# Altium schematic symbol library microbuilder.SCHLIB: 530 symbols (part 5 of 7)
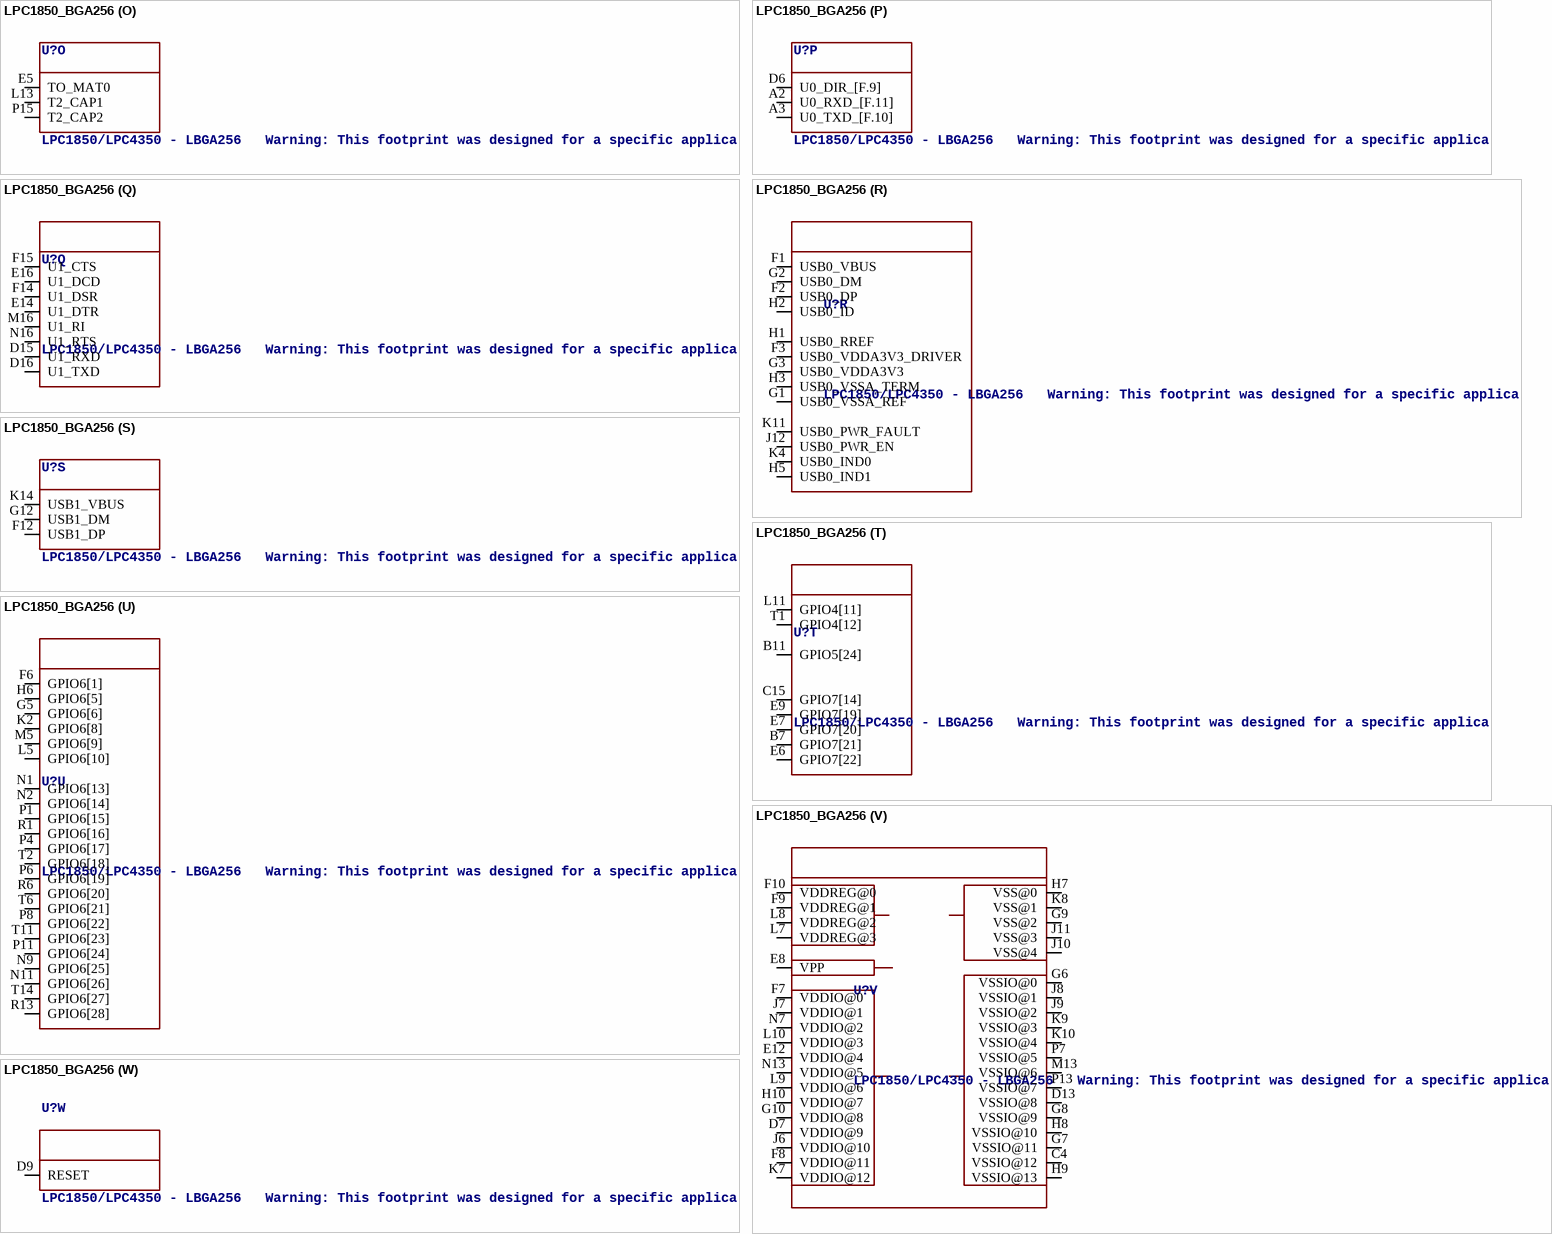
[diagram p56: symbol LPC1850_BGA256]

## LPC1850_BGA256
designator U?, comment LPC1850/LPC4350 - LBGA256   Warning: This footprint was designed for a specific application, and numerous choices have been made concering the PINMUX to make certain peripherals available at the expense of others.  These pin choices may not be appropriate in your own situation (for example, only one set of selection pins is broken out for the EMC rather than all four, although some pins on GPIO6 can be sacrificed to enable another memory device on the EMC using CS2).
footprint LBGA256_1.0MM
part A pins: A4 ADC1_2, A5 ADC1_6, B2 VSSA, B3 ADC1_5, B4 VDDA, B5 ADC1_3, C3 ADC1_1, C5 ADC1_7, C6 ADC1_4, E3 DAC, F5 ADC1_0
part B pins: C16 EMC_A4, D14 EMC_CLK23, E15 EMC_A3, F16 EMC_A2, G13 EMC_A23, G15 EMC_DQMOUT0, G16 EMC_A1, H12 EMC_CKEOUT0, H13 EMC_A14, H14 EMC_A9, H15 EMC_DQMOUT1, H16 EMC_A0, J13 EMC_A15, J15 EMC_DYCS0, J16 EMC_A8, K12 EMC_A21, K13 EMC_A22, K16 EMC_A10, L14 EMC_BLS1, M14 EMC_A20, M15 EMC_A11, N3 EMC_D12, N5 EMC_CLK01, N14 EMC_A19, N15 EMC_A12, P2 EMC_A5, P3 EMC_D13, P5 EMC_OE, P9 EMC_D8, P10 EMC_D9, P14 EMC_A18, P16 EMC_RAS, R2 EMC_A6, R3 EMC_A7, R4 EMC_D14, R5 EMC_CS0, R7 EMC_D1, R8 EMC_D3, R9 EMC_D5, R10 EMC_D6, R11 EMC_D7, R12 EMC_D11, R14 EMC_A16, R16 EMC_CAS, T3 EMC_BLS0, T4 EMC_WE, T5 EMC_D0, T7 EMC_D2, T8 EMC_D15, T9 EMC_D4, T13 EMC_D10, T15 EMC_A17, T16 EMC_A13
part C pins: A1 LCD_VD0_[4.1], A6 LCD_VD13_[B.6], A7 LCD_VD8_[7.5], A12 LCD_VD14_[B.5], A13 LCD_VD20_[B.3], A14 LCD_VD22_[B.1], A16 LCD_VD18_[7.2], B1 LCD_VD1_[4.4], B6 LCD_PWR_[7.7], B12 LCD_VD21_[B.2], B15 LCD_VD23_[B.0], B16 LCD_LE_[7.0], C1 LCD_ENBL_[4.6], C2 LCD_VD2_[4.3], C7 LCD_LP_[7.6], C8 LCD_VD16_[7.4], C13 LCD_VD17_[7.3], C14 LCD_VD19_[7.1], D2 LCD_FP_[4.5], D3 LCD_VD3_[4.2], E2 LCD_VD9_[4.8], G11 LCD_VD15_[B.4], H4 LCD_DCLK_[4.7], J1 LCD_VD6_[8.5], J2 LCD_VD7_[8.4], J3 LCD_VD12_[8.3], K1 LCD_VD4_[8.7], K3 LCD_VD5_[8.6], L2 LCD_VD11_[4.9], M3 LCD_VD10_[4.10]
part D pins: A8 RTCX1, A11 RTC_ALARM, B8 RTCX2, B10 VBAT
part E pins: L1 CGU_OUT0, L12 CGU_OUT1
part F pins: D4 ENET_RX_CLK, E4 ENET_MDC, F4 ENET_TX_EN, G4 ENET_TX_ER, L3 ENET_RXD1, M2 ENET_COL, M6 ENET_RXD2, M7 ENET_CRS, M8 ENET_MDIO, M9 ENET_TXD3, M10 ENET_TXD1, M11 ENET_TX_CLK, N4 ENET_RX_DV, N6 ENET_RX_ER, N8 ENET_RXD3, N10 ENET_TXD2, N12 ENET_TXD0, T12 ENET_RXD0
part G pins: D1 XTAL1, E1 XTAL2, T10 CLKOUT
part H pins: E13 I2C1_SCL, G14 I2C1_SDA, L15 I2C0_SCL, L16 I2C0_SDA
part I pins: D10 I2S0_RX_SCK, F11 I2S0_RX_SDA, F13 I2S0_TX_SCK, L6 I2S0_TX_SDA, M1 I2S0_TX_WS, R15 I2S0_RX_WS
part J pins: J4 TDI, J5 TCK/SWDCLK, K5 TDO/SWO, K6 TMS/SWDIO, L4 DBGEN, M4 TRST
part K pins: A9 WAKEUP0, A10 WAKEUP1, C9 WAKEUP2, D5 NMI_EXT, D8 WAKEUP3
part L pins: H11 QEI_PHA, J14 QEI_IDX, K15 QEI_PHB
part M pins: A15 SPIFI_SIO3, B13 SPIFI_MISO, B14 SPIFI_SCK, C10 SPIFI_CS, C11 SPIFI_MOSI, C12 SPIFI_SIO2
part N pins: D11 SSP0_MISO, D12 SSP0_SCK, E10 SSP0_MOSI, E11 SSP0_SSEL
part O pins: E5 TO_MAT0, L13 T2_CAP1, P15 T2_CAP2
part P pins: A2 U0_RXD_[F.11], A3 U0_TXD_[F.10], D6 U0_DIR_[F.9]
part Q pins: D15 U1_RXD, D16 U1_TXD, E14 U1_DTR, E16 U1_DCD, F14 U1_DSR, F15 U1_CTS, M16 U1_RI, N16 U1_RTS
part R pins: F1 USB0_VBUS, F2 USB0_DP, F3 USB0_VDDA3V3_DRIVER, G1 USB0_VSSA_REF, G2 USB0_DM, G3 USB0_VDDA3V3, H1 USB0_RREF, H2 USB0_ID, H3 USB0_VSSA_TERM, H5 USB0_IND1, J12 USB0_PWR_EN, K4 USB0_IND0, K11 USB0_PWR_FAULT
part S pins: F12 USB1_DP, G12 USB1_DM, K14 USB1_VBUS
part T pins: B7 GPIO7[21], B11 GPIO5[24], C15 GPIO7[14], E6 GPIO7[22], E7 GPIO7[20], E9 GPIO7[19], L11 GPIO4[11], T1 GPIO4[12]
part U pins: F6 GPIO6[1], G5 GPIO6[6], H6 GPIO6[5], K2 GPIO6[8], L5 GPIO6[10], M5 GPIO6[9], N1 GPIO6[13], N2 GPIO6[14], N9 GPIO6[25], N11 GPIO6[26], P1 GPIO6[15], P4 GPIO6[17], P6 GPIO6[19], P8 GPIO6[22], P11 GPIO6[24], R1 GPIO6[16], R6 GPIO6[20], R13 GPIO6[28], T2 GPIO6[18], T6 GPIO6[21], T11 GPIO6[23], T14 GPIO6[27]
part V pins: C4 VSSIO@12 (power), D7 VDDIO@9 (power), D13 VSSIO@8 (power), E8 VPP (power), E12 VDDIO@4 (power), F7 VDDIO@0 (power), F8 VDDIO@11 (power), F9 VDDREG@1 (power), F10 VDDREG@0 (power), G6 VSSIO@0 (power), G7 VSSIO@11 (power), G8 VSSIO@9 (power), G9 VSS@2 (power), G10 VDDIO@8 (power), H7 VSS@0 (power), H8 VSSIO@10 (power), H9 VSSIO@13 (power), H10 VDDIO@7 (power), J6 VDDIO@10 (power), J7 VDDIO@1 (power), J8 VSSIO@1 (power), J9 VSSIO@2 (power), J10 VSS@4 (power), J11 VSS@3 (power), K7 VDDIO@12 (power), K8 VSS@1 (power), K9 VSSIO@3 (power), K10 VSSIO@4 (power), L7 VDDREG@3 (power), L8 VDDREG@2 (power), L9 VDDIO@6 (power), L10 VDDIO@3 (power), M13 VSSIO@6 (power), N7 VDDIO@2 (power), N13 VDDIO@5 (power), P7 VSSIO@5 (power), P13 VSSIO@7 (power)
part W pins: D9 RESET

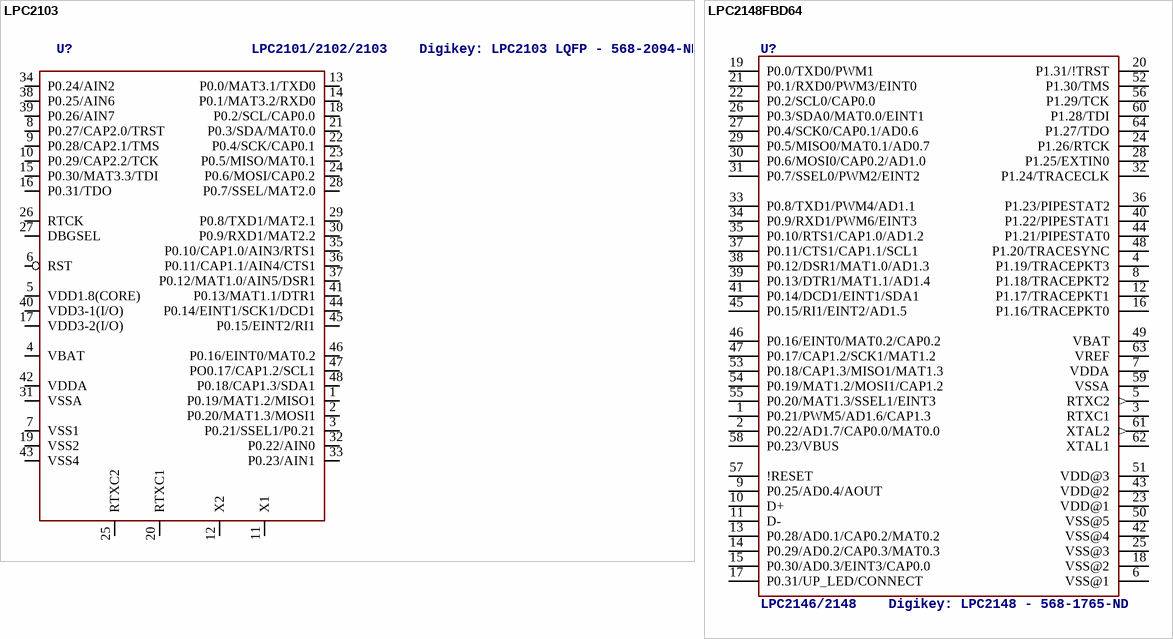
[diagram p39: symbols LPC2103 to LPC2148FBD64]

## LPC2103
designator U?, comment LPC2101/2102/2103    Digikey: LPC2103 LQFP - 568-2094-ND
footprint LQFP48
pins: 1 P0.19/MAT1.2/MISO1, 2 P0.20/MAT1.3/MOSI1, 3 P0.21/SSEL1/P0.21, 4 VBAT, 5 VDD1.8(CORE), 6 RST, 7 VSS1, 8 P0.27/CAP2.0/TRST, 9 P0.28/CAP2.1/TMS, 10 P0.29/CAP2.2/TCK, 11 X1, 12 X2, 13 P0.0/MAT3.1/TXD0, 14 P0.1/MAT3.2/RXD0, 15 P0.30/MAT3.3/TDI, 16 P0.31/TDO, 17 VDD3-2(I/O), 18 P0.2/SCL/CAP0.0, 19 VSS2, 20 RTXC1, 21 P0.3/SDA/MAT0.0, 22 P0.4/SCK/CAP0.1, 23 P0.5/MISO/MAT0.1, 24 P0.6/MOSI/CAP0.2, 25 RTXC2, 26 RTCK, 27 DBGSEL, 28 P0.7/SSEL/MAT2.0, 29 P0.8/TXD1/MAT2.1, 30 P0.9/RXD1/MAT2.2, 31 VSSA, 32 P0.22/AIN0, 33 P0.23/AIN1, 34 P0.24/AIN2, 35 P0.10/CAP1.0/AIN3/RTS1, 36 P0.11/CAP1.1/AIN4/CTS1, 37 P0.12/MAT1.0/AIN5/DSR1, 38 P0.25/AIN6, 39 P0.26/AIN7, 40 VDD3-1(I/O), 41 P0.13/MAT1.1/DTR1, 42 VDDA, 43 VSS4, 44 P0.14/EINT1/SCK1/DCD1, 45 P0.15/EINT2/RI1, 46 P0.16/EINT0/MAT0.2, 47 PO0.17/CAP1.2/SCL1, 48 P0.18/CAP1.3/SDA1

## LPC2148FBD64
designator U?, comment LPC2146/2148    Digikey: LPC2148 - 568-1765-ND
footprint LQFP64
pins: 1 P0.21/PWM5/AD1.6/CAP1.3, 2 P0.22/AD1.7/CAP0.0/MAT0.0, 3 RTXC1, 4 P1.19/TRACEPKT3, 5 RTXC2 (out), 6 VSS@1 (power), 7 VDDA (power), 8 P1.18/TRACEPKT2, 9 P0.25/AD0.4/AOUT, 10 D+, 11 D-, 12 P1.17/TRACEPKT1, 13 P0.28/AD0.1/CAP0.2/MAT0.2, 14 P0.29/AD0.2/CAP0.3/MAT0.3, 15 P0.30/AD0.3/EINT3/CAP0.0, 16 P1.16/TRACEPKT0, 17 P0.31/UP_LED/CONNECT, 18 VSS@2 (power), 19 P0.0/TXD0/PWM1, 20 P1.31/!TRST, 21 P0.1/RXD0/PWM3/EINT0, 22 P0.2/SCL0/CAP0.0, 23 VDD@1 (power), 24 P1.26/RTCK, 25 VSS@3 (power), 26 P0.3/SDA0/MAT0.0/EINT1, 27 P0.4/SCK0/CAP0.1/AD0.6, 28 P1.25/EXTIN0, 29 P0.5/MISO0/MAT0.1/AD0.7, 30 P0.6/MOSI0/CAP0.2/AD1.0, 31 P0.7/SSEL0/PWM2/EINT2, 32 P1.24/TRACECLK, 33 P0.8/TXD1/PWM4/AD1.1, 34 P0.9/RXD1/PWM6/EINT3, 35 P0.10/RTS1/CAP1.0/AD1.2, 36 P1.23/PIPESTAT2, 37 P0.11/CTS1/CAP1.1/SCL1, 38 P0.12/DSR1/MAT1.0/AD1.3, 39 P0.13/DTR1/MAT1.1/AD1.4, 40 P1.22/PIPESTAT1, 41 P0.14/DCD1/EINT1/SDA1, 42 VSS@4 (power), 43 VDD@2 (power), 44 P1.21/PIPESTAT0, 45 P0.15/RI1/EINT2/AD1.5, 46 P0.16/EINT0/MAT0.2/CAP0.2, 47 P0.17/CAP1.2/SCK1/MAT1.2, 48 P1.20/TRACESYNC, 49 VBAT (power), 50 VSS@5 (power), 51 VDD@3 (power), 52 P1.30/TMS, 53 P0.18/CAP1.3/MISO1/MAT1.3, 54 P0.19/MAT1.2/MOSI1/CAP1.2, 55 P0.20/MAT1.3/SSEL1/EINT3, 56 P1.29/TCK, 57 !RESET, 58 P0.23/VBUS, 59 VSSA (power), 60 P1.28/TDI, 61 XTAL2 (out), 62 XTAL1, 63 VREF, 64 P1.27/TDO

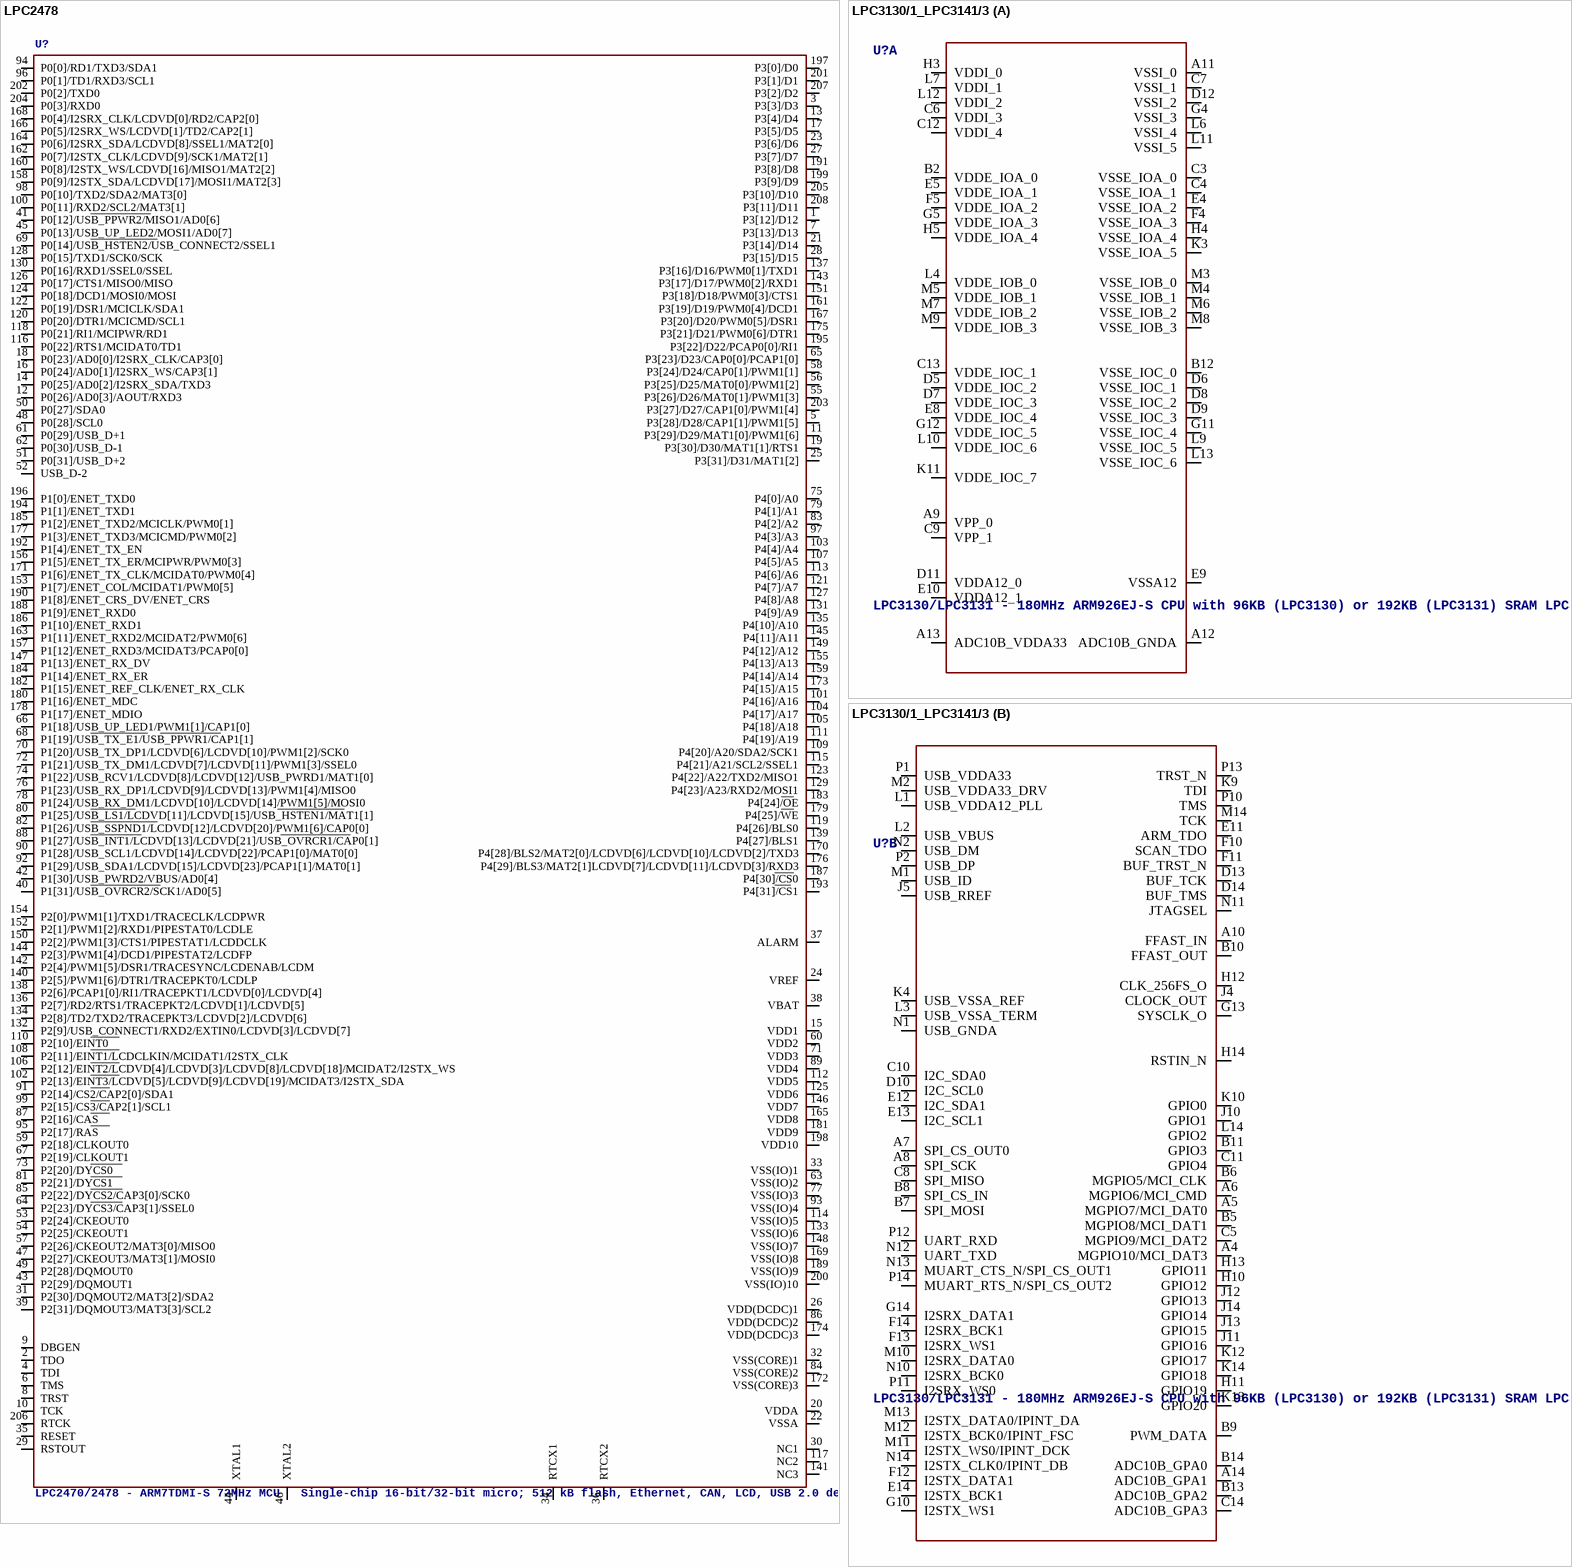
[diagram p40: symbols LPC2478 to LPC3130/1_LPC3141/3]

## LPC2478
designator U?, comment LPC2470/2478 - ARM7TDMI-S 72MHz MCU   Single-chip 16-bit/32-bit micro; 512 kB flash, Ethernet, CAN, LCD, USB 2.0 device/host/OTG, external memory interface   Digikey: 568-4363-ND
footprint LQFP208
pins: 1 P3[12]/D12, 2 TDO, 3 P3[3]/D3, 4 TDI, 5 P3[28]/D28/CAP1[1]/PWM1[5], 6 TMS, 7 P3[13]/D13, 8 TRST, 9 DBGEN, 10 TCK, 11 P3[29]/D29/MAT1[0]/PWM1[6], 12 P0[26]/AD0[3]/AOUT/RXD3, 13 P3[4]/D4, 14 P0[25]/AD0[2]/I2SRX_SDA/TXD3, 15 VDD1, 16 P0[24]/AD0[1]/I2SRX_WS/CAP3[1], 17 P3[5]/D5, 18 P0[23]/AD0[0]/I2SRX_CLK/CAP3[0], 19 P3[30]/D30/MAT1[1]/RTS1, 20 VDDA, 21 P3[14]/D14, 22 VSSA, 23 P3[6]/D6, 24 VREF, 25 P3[31]/D31/MAT1[2], 26 VDD(DCDC)1, 27 P3[7]/D7, 28 P3[15]/D15, 29 RSTOUT, 30 NC1, 31 P2[30]/DQMOUT2/MAT3[2]/SDA2, 32 VSS(CORE)1, 33 VSS(IO)1, 34 RTCX1, 35 RESET, 36 RTCX2, 37 ALARM, 38 VBAT, 39 P2[31]/DQMOUT3/MAT3[3]/SCL2, 40 P1[31]/USB_OVRCR2/SCK1/AD0[5], 41 P0[12]/USB_PPWR2/MISO1/AD0[6], 42 P1[30]/USB_PWRD2/VBUS/AD0[4], 43 P2[29]/DQMOUT1, 44 XTAL1, 45 P0[13]/USB_UP_LED2/MOSI1/AD0[7], 46 XTAL2, 47 P2[27]/CKEOUT3/MAT3[1]/MOSI0, 48 P0[28]/SCL0, 49 P2[28]/DQMOUT0, 50 P0[27]/SDA0, 51 P0[31]/USB_D+2, 52 USB_D-2, 53 P2[24]/CKEOUT0, 54 P2[25]/CKEOUT1, 55 P3[26]/D26/MAT0[1]/PWM1[3], 56 P3[25]/D25/MAT0[0]/PWM1[2], 57 P2[26]/CKEOUT2/MAT3[0]/MISO0, 58 P3[24]/D24/CAP0[1]/PWM1[1], 59 P2[18]/CLKOUT0, 60 VDD2, 61 P0[29]/USB_D+1, 62 P0[30]/USB_D-1, 63 VSS(IO)2, 64 P2[23]/DYCS3/CAP3[1]/SSEL0, 65 P3[23]/D23/CAP0[0]/PCAP1[0], 66 P1[18]/USB_UP_LED1/PWM1[1]/CAP1[0], 67 P2[19]/CLKOUT1, 68 P1[19]/USB_TX_E1/USB_PPWR1/CAP1[1], 69 P0[14]/USB_HSTEN2/USB_CONNECT2/SSEL1, 70 P1[20]/USB_TX_DP1/LCDVD[6]/LCDVD[10]/PWM1[2]/SCK0, 71 VDD3, 72 P1[21]/USB_TX_DM1/LCDVD[7]/LCDVD[11]/PWM1[3]/SSEL0, 73 P2[20]/DYCS0, 74 P1[22]/USB_RCV1/LCDVD[8]/LCDVD[12]/USB_PWRD1/MAT1[0], 75 P4[0]/A0, 76 P1[23]/USB_RX_DP1/LCDVD[9]/LCDVD[13]/PWM1[4]/MISO0, 77 VSS(IO)3, 78 P1[24]/USB_RX_DM1/LCDVD[10]/LCDVD[14]/PWM1[5]/MOSI0, 79 P4[1]/A1, 80 P1[25]/USB_LS1/LCDVD[11]/LCDVD[15]/USB_HSTEN1/MAT1[1], 81 P2[21]/DYCS1, 82 P1[26]/USB_SSPND1/LCDVD[12]/LCDVD[20]/PWM1[6]/CAP0[0], 83 P4[2]/A2, 84 VSS(CORE)2, 85 P2[22]/DYCS2/CAP3[0]/SCK0, 86 VDD(DCDC)2, 87 P2[16]/CAS, 88 P1[27]/USB_INT1/LCDVD[13]/LCDVD[21]/USB_OVRCR1/CAP0[1], 89 VDD4, 90 P1[28]/USB_SCL1/LCDVD[14]/LCDVD[22]/PCAP1[0]/MAT0[0], 91 P2[14]/CS2/CAP2[0]/SDA1, 92 P1[29]/USB_SDA1/LCDVD[15]/LCDVD[23]/PCAP1[1]/MAT0[1], 93 VSS(IO)4, 94 P0[0]/RD1/TXD3/SDA1, 95 P2[17]/RAS, 96 P0[1]/TD1/RXD3/SCL1, 97 P4[3]/A3, 98 P0[10]/TXD2/SDA2/MAT3[0], 99 P2[15]/CS3/CAP2[1]/SCL1, 100 P0[11]/RXD2/SCL2/MAT3[1], 101 P4[16]/A16, 102 P2[13]/EINT3/LCDVD[5]/LCDVD[9]/LCDVD[19]/MCIDAT3/I2STX_SDA, 103 P4[4]/A4, 104 P4[17]/A17, 105 P4[18]/A18, 106 P2[12]/EINT2/LCDVD[4]/LCDVD[3]/LCDVD[8]/LCDVD[18]/MCIDAT2/I2STX_WS, 107 P4[5]/A5, 108 P2[11]/EINT1/LCDCLKIN/MCIDAT1/I2STX_CLK, 109 P4[20]/A20/SDA2/SCK1, 110 P2[10]/EINT0, 111 P4[19]/A19, 112 VDD5, 113 P4[6]/A6, 114 VSS(IO)5, 115 P4[21]/A21/SCL2/SSEL1, 116 P0[22]/RTS1/MCIDAT0/TD1, 117 NC2, 118 P0[21]/RI1/MCIPWR/RD1, 119 P4[26]/BLS0, 120 P0[20]/DTR1/MCICMD/SCL1, 121 P4[7]/A7, 122 P0[19]/DSR1/MCICLK/SDA1, 123 P4[22]/A22/TXD2/MISO1, 124 P0[18]/DCD1/MOSI0/MOSI, 125 VDD6, 126 P0[17]/CTS1/MISO0/MISO, 127 P4[8]/A8, 128 P0[15]/TXD1/SCK0/SCK, 129 P4[23]/A23/RXD2/MOSI1, 130 P0[16]/RXD1/SSEL0/SSEL, 131 P4[9]/A9, 132 P2[9]/USB_CONNECT1/RXD2/EXTIN0/LCDVD[3]/LCDVD[7], 133 VSS(IO)6, 134 P2[8]/TD2/TXD2/TRACEPKT3/LCDVD[2]/LCDVD[6], 135 P4[10]/A10, 136 P2[7]/RD2/RTS1/TRACEPKT2/LCDVD[1]/LCDVD[5], 137 P3[16]/D16/PWM0[1]/TXD1, 138 P2[6]/PCAP1[0]/RI1/TRACEPKT1/LCDVD[0]/LCDVD[4], 139 P4[27]/BLS1, 140 P2[5]/PWM1[6]/DTR1/TRACEPKT0/LCDLP, 141 NC3, 142 P2[4]/PWM1[5]/DSR1/TRACESYNC/LCDENAB/LCDM, 143 P3[17]/D17/PWM0[2]/RXD1, 144 P2[3]/PWM1[4]/DCD1/PIPESTAT2/LCDFP, 145 P4[11]/A11, 146 VDD7, 147 P1[13]/ENET_RX_DV, 148 VSS(IO)7, 149 P4[12]/A12, 150 P2[2]/PWM1[3]/CTS1/PIPESTAT1/LCDDCLK, 151 P3[18]/D18/PWM0[3]/CTS1, 152 P2[1]/PWM1[2]/RXD1/PIPESTAT0/LCDLE, 153 P1[7]/ENET_COL/MCIDAT1/PWM0[5], 154 P2[0]/PWM1[1]/TXD1/TRACECLK/LCDPWR, 155 P4[13]/A13, 156 P1[5]/ENET_TX_ER/MCIPWR/PWM0[3], 157 P1[12]/ENET_RXD3/MCIDAT3/PCAP0[0], 158 P0[9]/I2STX_SDA/LCDVD[17]/MOSI1/MAT2[3], 159 P4[14]/A14, 160 P0[8]/I2STX_WS/LCDVD[16]/MISO1/MAT2[2], 161 P3[19]/D19/PWM0[4]/DCD1, 162 P0[7]/I2STX_CLK/LCDVD[9]/SCK1/MAT2[1], 163 P1[11]/ENET_RXD2/MCIDAT2/PWM0[6], 164 P0[6]/I2SRX_SDA/LCDVD[8]/SSEL1/MAT2[0], 165 VDD8, 166 P0[5]/I2SRX_WS/LCDVD[1]/TD2/CAP2[1], 167 P3[20]/D20/PWM0[5]/DSR1, 168 P0[4]/I2SRX_CLK/LCDVD[0]/RD2/CAP2[0], 169 VSS(IO)8, 170 P4[28]/BLS2/MAT2[0]/LCDVD[6]/LCDVD[10]/LCDVD[2]/TXD3, 171 P1[6]/ENET_TX_CLK/MCIDAT0/PWM0[4], 172 VSS(CORE)3, 173 P4[15]/A15, 174 VDD(DCDC)3, 175 P3[21]/D21/PWM0[6]/DTR1, 176 P4[29]/BLS3/MAT2[1]LCDVD[7]/LCDVD[11]/LCDVD[3]/RXD3, 177 P1[3]/ENET_TXD3/MCICMD/PWM0[2], 178 P1[17]/ENET_MDIO, 179 P4[25]/WE, 180 P1[16]/ENET_MDC, 181 VDD9, 182 P1[15]/ENET_REF_CLK/ENET_RX_CLK, 183 P4[24]/OE, 184 P1[14]/ENET_RX_ER, 185 P1[2]/ENET_TXD2/MCICLK/PWM0[1], 186 P1[10]/ENET_RXD1, 187 P4[30]/CS0, 188 P1[9]/ENET_RXD0, 189 VSS(IO)9, 190 P1[8]/ENET_CRS_DV/ENET_CRS, 191 P3[8]/D8, 192 P1[4]/ENET_TX_EN, 193 P4[31]/CS1, 194 P1[1]/ENET_TXD1, 195 P3[22]/D22/PCAP0[0]/RI1, 196 P1[0]/ENET_TXD0, 197 P3[0]/D0, 198 VDD10, 199 P3[9]/D9, 200 VSS(IO)10, 201 P3[1]/D1, 202 P0[2]/TXD0, 203 P3[27]/D27/CAP1[0]/PWM1[4], 204 P0[3]/RXD0, 205 P3[10]/D10, 206 RTCK, 207 P3[2]/D2, 208 P3[11]/D11

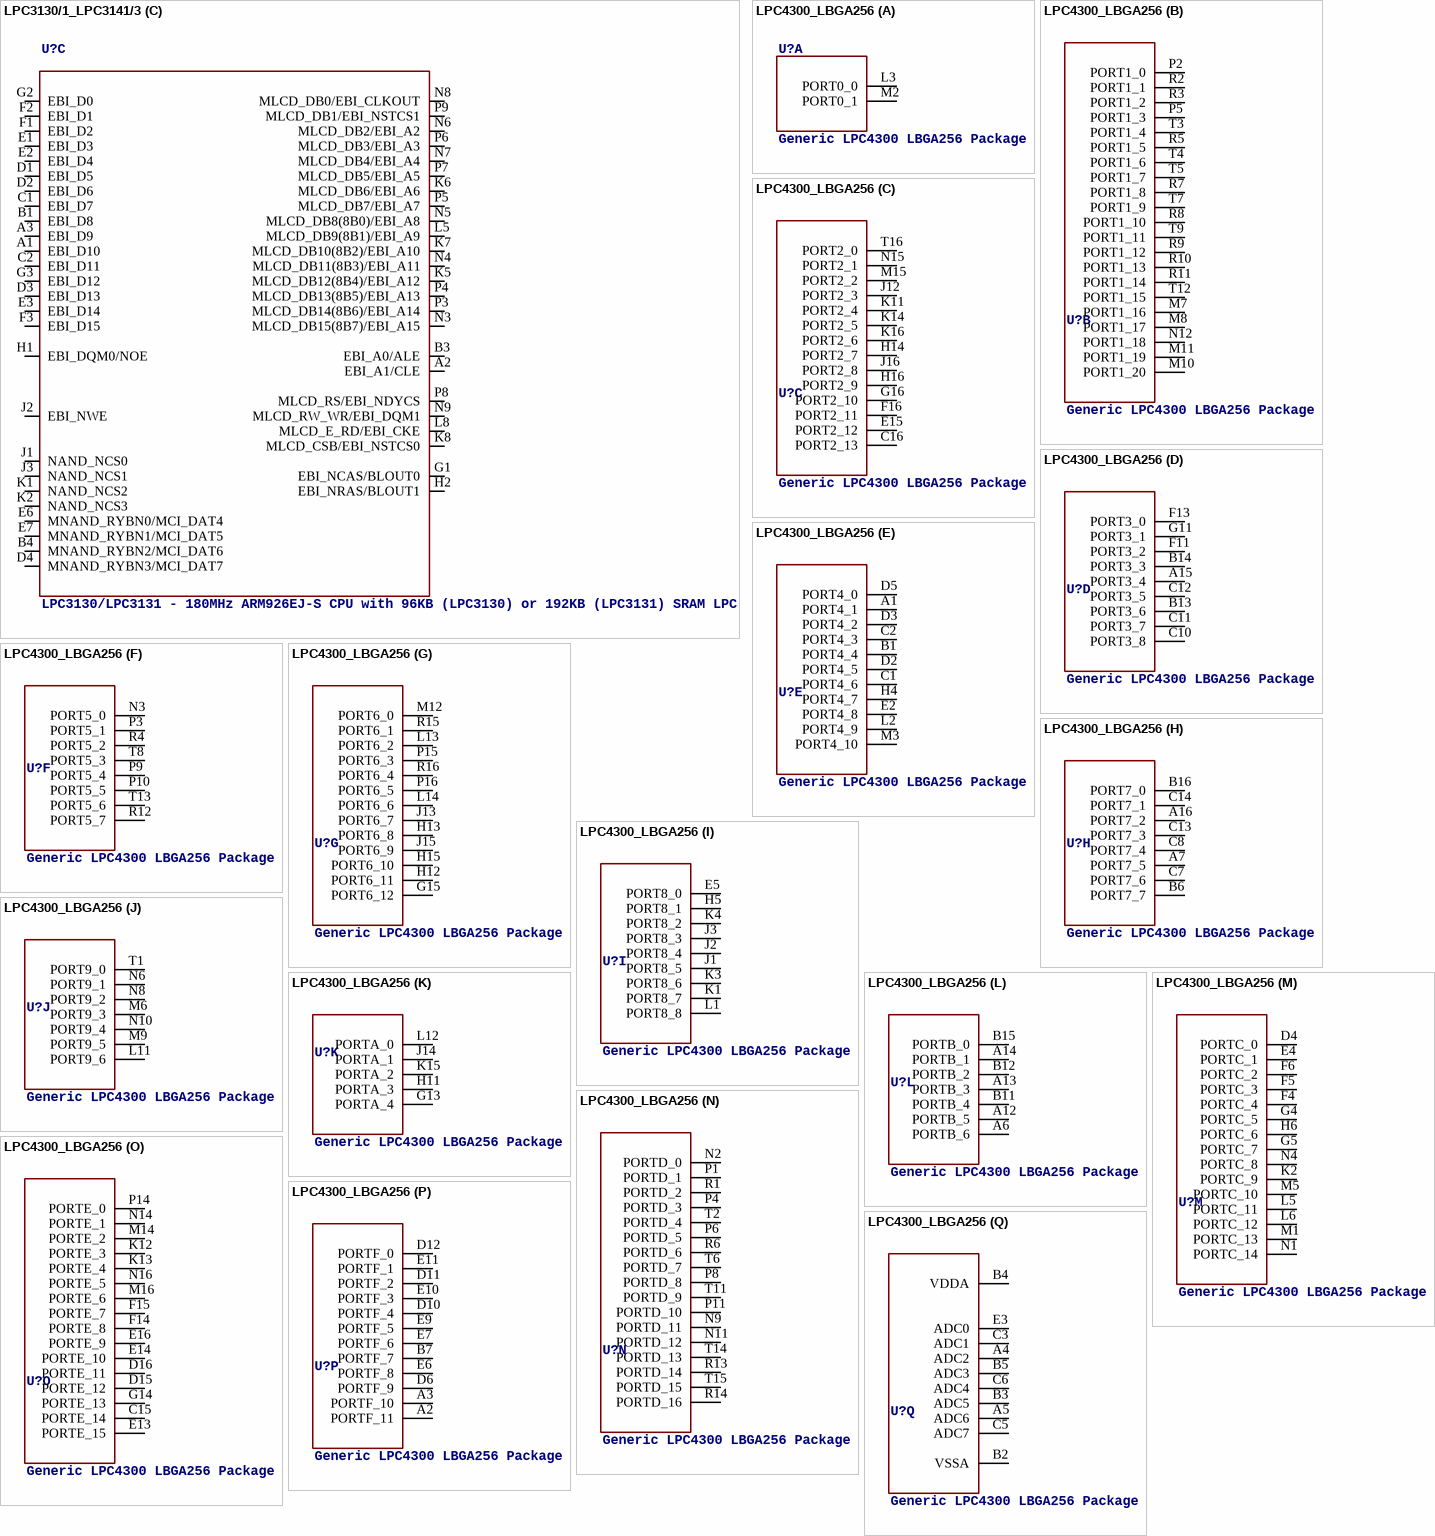
[diagram p41: symbols LPC3130/1_LPC3141/3 to LPC4300_LBGA256]

## LPC3130/1_LPC3141/3
designator U?, comment LPC3130/LPC3131 - 180MHz ARM926EJ-S CPU with 96KB (LPC3130) or 192KB (LPC3131) SRAM LPC3141 - 270MHz ARM926EJ-S CPU with 192KB SRAM LPC3143 - 270MHz ARM926EJ-S CPU with 192KB SRAM and AES decryption engine/128-bit unique ID (LPC3143 only)
footprint TFBGA180_0.8
part A pins: A9 VPP_0 (power), A11 VSSI_0 (power), A12 ADC10B_GNDA (power), A13 ADC10B_VDDA33 (power), B2 VDDE_IOA_0 (power), B12 VSSE_IOC_0 (power), C3 VSSE_IOA_0 (power), C4 VSSE_IOA_1 (power), C6 VDDI_3 (power), C7 VSSI_1 (power), C9 VPP_1 (power), C12 VDDI_4 (power), C13 VDDE_IOC_1 (power), D5 VDDE_IOC_2 (power), D6 VSSE_IOC_1 (power), D7 VDDE_IOC_3 (power), D8 VSSE_IOC_2 (power), D9 VSSE_IOC_3 (power), D11 VDDA12_0 (power), D12 VSSI_2 (power), E4 VSSE_IOA_2 (power), E5 VDDE_IOA_1 (power), E8 VDDE_IOC_4 (power), E9 VSSA12 (power), E10 VDDA12_1 (power), F4 VSSE_IOA_3 (power), F5 VDDE_IOA_2 (power), G4 VSSI_3 (power), G5 VDDE_IOA_3 (power), G11 VSSE_IOC_4 (power), G12 VDDE_IOC_5 (power), H3 VDDI_0 (power), H4 VSSE_IOA_4 (power), H5 VDDE_IOA_4 (power), K3 VSSE_IOA_5 (power), K11 VDDE_IOC_7 (power), L4 VDDE_IOB_0 (power), L6 VSSI_4 (power), L7 VDDI_1 (power), L9 VSSE_IOC_5 (power), L10 VDDE_IOC_6 (power), L11 VSSI_5 (power), L12 VDDI_2 (power), L13 VSSE_IOC_6 (power), M3 VSSE_IOB_0 (power), M4 VSSE_IOB_1 (power), M5 VDDE_IOB_1 (power), M6 VSSE_IOB_2 (power), M7 VDDE_IOB_2 (power), M8 VSSE_IOB_3 (power), M9 VDDE_IOB_3 (power)
part B pins: A4 MGPIO10/MCI_DAT3, A5 MGPIO7/MCI_DAT0, A6 MGPIO6/MCI_CMD, A7 SPI_CS_OUT0, A8 SPI_SCK, A10 FFAST_IN, A14 ADC10B_GPA1, B5 MGPIO8/MCI_DAT1, B6 MGPIO5/MCI_CLK, B7 SPI_MOSI, B8 SPI_CS_IN, B9 PWM_DATA, B10 FFAST_OUT, B11 GPIO3, B13 ADC10B_GPA2, B14 ADC10B_GPA0, C5 MGPIO9/MCI_DAT2, C8 SPI_MISO, C10 I2C_SDA0, C11 GPIO4, C14 ADC10B_GPA3, D10 I2C_SCL0, D13 BUF_TCK, D14 BUF_TMS, E11 ARM_TDO, E12 I2C_SDA1, E13 I2C_SCL1, E14 I2STX_BCK1, F10 SCAN_TDO, F11 BUF_TRST_N, F12 I2STX_DATA1, F13 I2SRX_WS1, F14 I2SRX_BCK1, G10 I2STX_WS1, G13 SYSCLK_O, G14 I2SRX_DATA1, H10 GPIO12, H11 GPIO19, H12 CLK_256FS_O, H13 GPIO11, H14 RSTIN_N, J4 CLOCK_OUT, J5 USB_RREF, J10 GPIO1, J11 GPIO16, J12 GPIO13, J13 GPIO15, J14 GPIO14, K4 USB_VSSA_REF, K9 TDI, K10 GPIO0, K12 GPIO17, K13 GPIO20, K14 GPIO18, L1 USB_VDDA12_PLL, L2 USB_VBUS, L3 USB_VSSA_TERM, L14 GPIO2, M1 USB_ID, M2 USB_VDDA33_DRV, M10 I2SRX_DATA0, M11 I2STX_WS0/IPINT_DCK, M12 I2STX_BCK0/IPINT_FSC, M13 I2STX_DATA0/IPINT_DA, M14 TCK, N1 USB_GNDA, N2 USB_DM, N10 I2SRX_BCK0, N11 JTAGSEL, N12 UART_TXD, N13 MUART_CTS_N/SPI_CS_OUT1, N14 I2STX_CLK0/IPINT_DB, P1 USB_VDDA33, P2 USB_DP, P10 TMS, P11 I2SRX_WS0, P12 UART_RXD, P13 TRST_N, P14 MUART_RTS_N/SPI_CS_OUT2
part C pins: A1 EBI_D10, A2 EBI_A1/CLE, A3 EBI_D9, B1 EBI_D8, B3 EBI_A0/ALE, B4 MNAND_RYBN2/MCI_DAT6, C1 EBI_D7, C2 EBI_D11, D1 EBI_D5, D2 EBI_D6, D3 EBI_D13, D4 MNAND_RYBN3/MCI_DAT7, E1 EBI_D3, E2 EBI_D4, E3 EBI_D14, E6 MNAND_RYBN0/MCI_DAT4, E7 MNAND_RYBN1/MCI_DAT5, F1 EBI_D2, F2 EBI_D1, F3 EBI_D15, G1 EBI_NCAS/BLOUT0, G2 EBI_D0, G3 EBI_D12, H1 EBI_DQM0/NOE, H2 EBI_NRAS/BLOUT1, J1 NAND_NCS0, J2 EBI_NWE, J3 NAND_NCS1, K1 NAND_NCS2, K2 NAND_NCS3, K5 MLCD_DB12(8B4)/EBI_A12, K6 MLCD_DB6/EBI_A6, K7 MLCD_DB10(8B2)/EBI_A10, K8 MLCD_CSB/EBI_NSTCS0, L5 MLCD_DB9(8B1)/EBI_A9, L8 MLCD_E_RD/EBI_CKE, N3 MLCD_DB15(8B7)/EBI_A15, N4 MLCD_DB11(8B3)/EBI_A11, N5 MLCD_DB8(8B0)/EBI_A8, N6 MLCD_DB2/EBI_A2, N7 MLCD_DB4/EBI_A4, N8 MLCD_DB0/EBI_CLKOUT, N9 MLCD_RW_WR/EBI_DQM1, P3 MLCD_DB14(8B6)/EBI_A14, P4 MLCD_DB13(8B5)/EBI_A13, P5 MLCD_DB7/EBI_A7, P6 MLCD_DB3/EBI_A3, P7 MLCD_DB5/EBI_A5, P8 MLCD_RS/EBI_NDYCS, P9 MLCD_DB1/EBI_NSTCS1

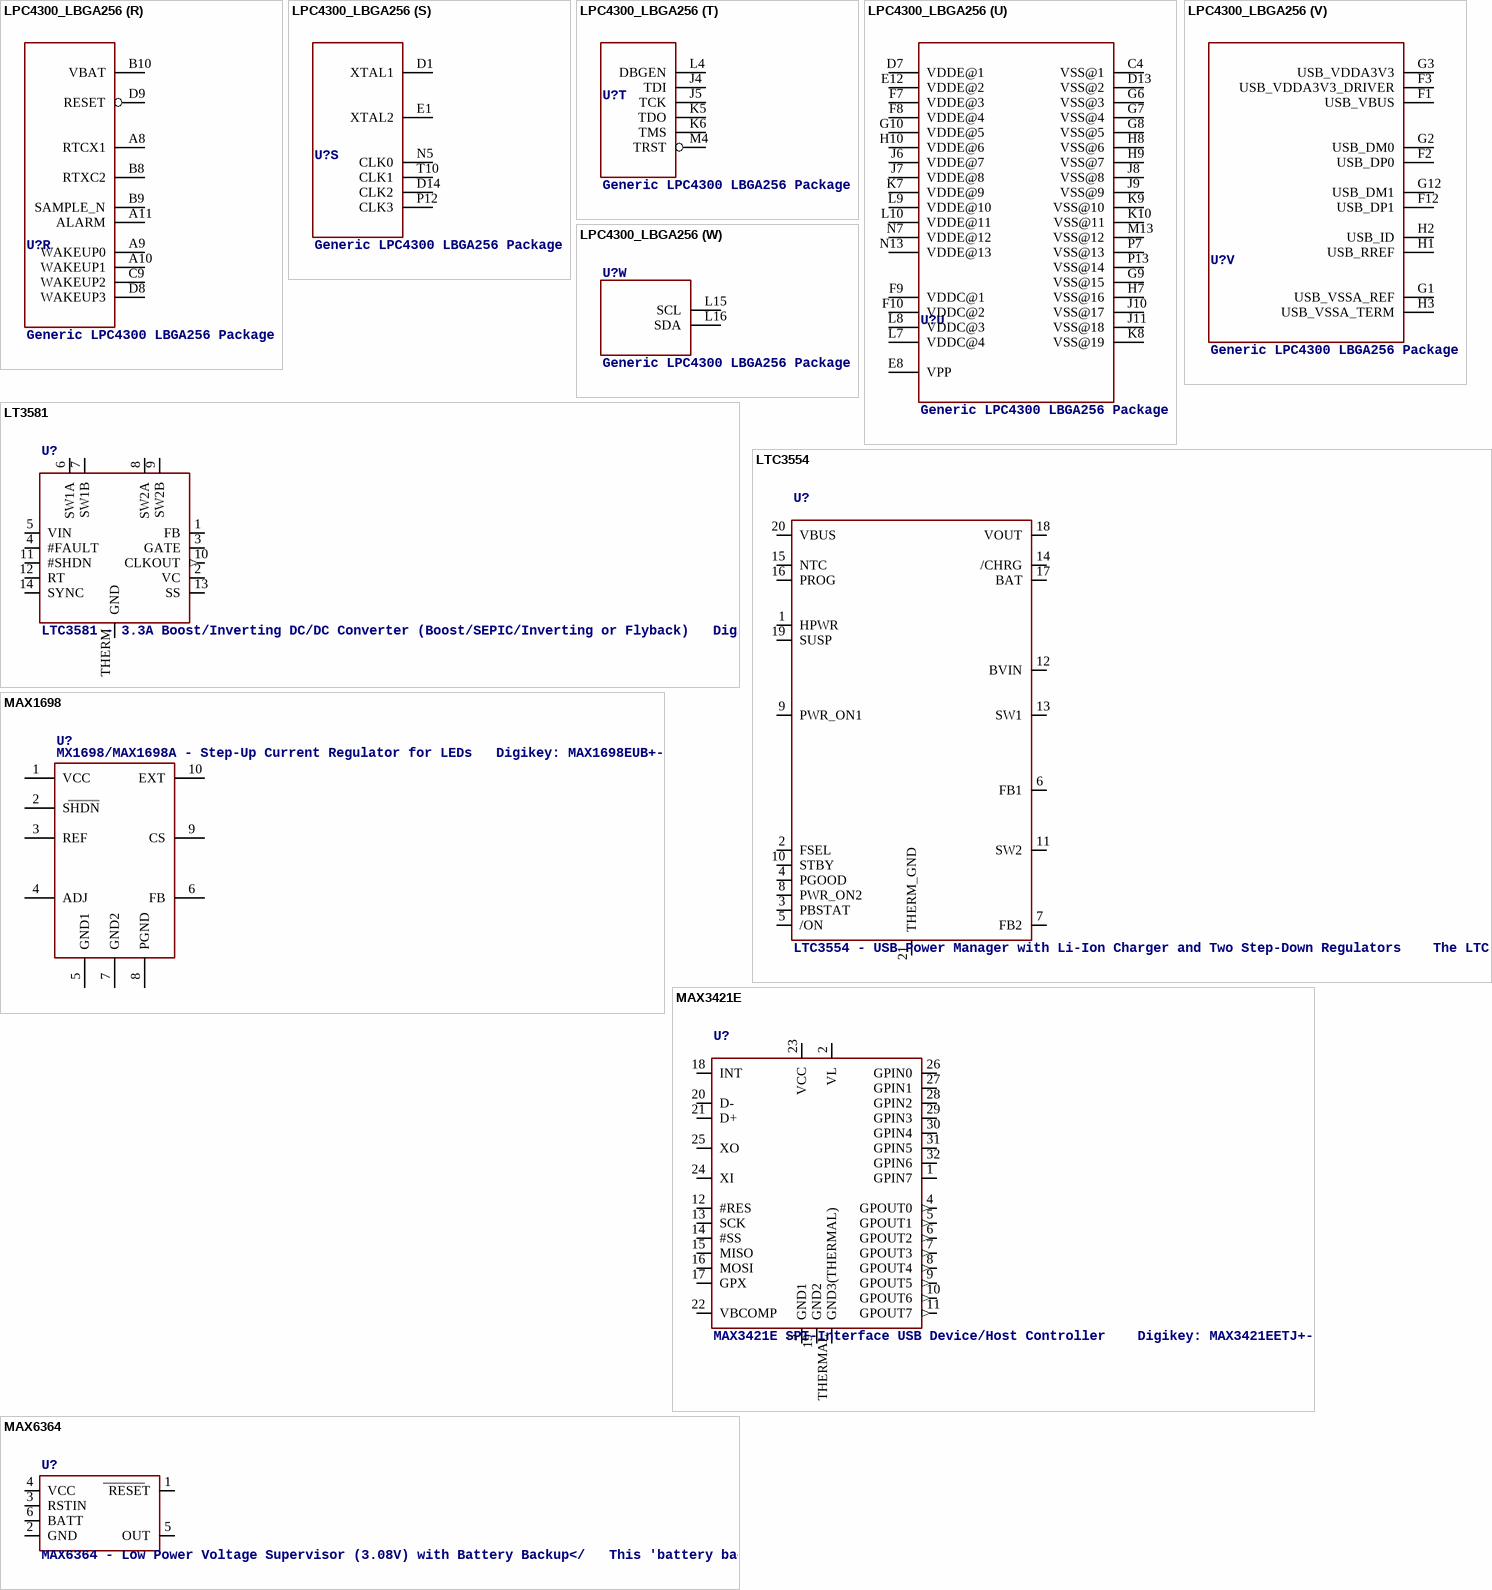
[diagram p42: symbols LPC4300_LBGA256 to MAX6364]

## LPC4300_LBGA256
designator U?, comment Generic LPC4300 LBGA256 Package
footprint LBGA256_1.0MM
part A pins: L3 PORT0_0, M2 PORT0_1
part B pins: M7 PORT1_16, M8 PORT1_17, M10 PORT1_20, M11 PORT1_19, N12 PORT1_18, P2 PORT1_0, P5 PORT1_3, R2 PORT1_1, R3 PORT1_2, R5 PORT1_5, R7 PORT1_8, R8 PORT1_10, R9 PORT1_12, R10 PORT1_13, R11 PORT1_14, T3 PORT1_4, T4 PORT1_6, T5 PORT1_7, T7 PORT1_9, T9 PORT1_11, T12 PORT1_15
part C pins: C16 PORT2_13, E15 PORT2_12, F16 PORT2_11, G16 PORT2_10, H14 PORT2_7, H16 PORT2_9, J12 PORT2_3, J16 PORT2_8, K11 PORT2_4, K14 PORT2_5, K16 PORT2_6, M15 PORT2_2, N15 PORT2_1, T16 PORT2_0
part D pins: A15 PORT3_4, B13 PORT3_6, B14 PORT3_3, C10 PORT3_8, C11 PORT3_7, C12 PORT3_5, F11 PORT3_2, F13 PORT3_0, G11 PORT3_1
part E pins: A1 PORT4_1, B1 PORT4_4, C1 PORT4_6, C2 PORT4_3, D2 PORT4_5, D3 PORT4_2, D5 PORT4_0, E2 PORT4_8, H4 PORT4_7, L2 PORT4_9, M3 PORT4_10
part F pins: N3 PORT5_0, P3 PORT5_1, P9 PORT5_4, P10 PORT5_5, R4 PORT5_2, R12 PORT5_7, T8 PORT5_3, T13 PORT5_6
part G pins: G15 PORT6_12, H12 PORT6_11, H13 PORT6_8, H15 PORT6_10, J13 PORT6_7, J15 PORT6_9, L13 PORT6_2, L14 PORT6_6, M12 PORT6_0, P15 PORT6_3, P16 PORT6_5, R15 PORT6_1, R16 PORT6_4
part H pins: A7 PORT7_5, A16 PORT7_2, B6 PORT7_7, B16 PORT7_0, C7 PORT7_6, C8 PORT7_4, C13 PORT7_3, C14 PORT7_1
part I pins: E5 PORT8_0, H5 PORT8_1, J1 PORT8_5, J2 PORT8_4, J3 PORT8_3, K1 PORT8_7, K3 PORT8_6, K4 PORT8_2, L1 PORT8_8 (oe)
part J pins: L11 PORT9_6, M6 PORT9_3, M9 PORT9_5, N6 PORT9_1, N8 PORT9_2, N10 PORT9_4, T1 PORT9_0
part K pins: G13 PORTA_4, H11 PORTA_3, J14 PORTA_1, K15 PORTA_2, L12 PORTA_0
part L pins: A6 PORTB_6, A12 PORTB_5, A13 PORTB_3, A14 PORTB_1, B11 PORTB_4, B12 PORTB_2, B15 PORTB_0
part M pins: D4 PORTC_0, E4 PORTC_1, F4 PORTC_4, F5 PORTC_3, F6 PORTC_2, G4 PORTC_5, G5 PORTC_7, H6 PORTC_6, K2 PORTC_9, L5 PORTC_11, L6 PORTC_12, M1 PORTC_13, M5 PORTC_10, N1 PORTC_14, N4 PORTC_8
part N pins: N2 PORTD_0, N9 PORTD_11, N11 PORTD_12, P1 PORTD_1, P4 PORTD_3, P6 PORTD_5, P8 PORTD_8, P11 PORTD_10, R1 PORTD_2, R6 PORTD_6, R13 PORTD_14, R14 PORTD_16, T2 PORTD_4, T6 PORTD_7, T11 PORTD_9, T14 PORTD_13, T15 PORTD_15
part O pins: C15 PORTE_14, D15 PORTE_12, D16 PORTE_11, E13 PORTE_15, E14 PORTE_10, E16 PORTE_9, F14 PORTE_8, F15 PORTE_7, G14 PORTE_13, K12 PORTE_3, K13 PORTE_4, M14 PORTE_2, M16 PORTE_6, N14 PORTE_1, N16 PORTE_5, P14 PORTE_0
part P pins: A2 PORTF_11, A3 PORTF_10, B7 PORTF_7, D6 PORTF_9, D10 PORTF_4, D11 PORTF_2, D12 PORTF_0, E6 PORTF_8, E7 PORTF_6, E9 PORTF_5, E10 PORTF_3, E11 PORTF_1
part Q pins: A4 ADC2, A5 ADC6, B2 VSSA (oe), B3 ADC5, B4 VDDA (oe), B5 ADC3, C3 ADC1, C5 ADC7, C6 ADC4, E3 ADC0
part R pins: A8 RTCX1, A9 WAKEUP0, A10 WAKEUP1, A11 ALARM, B8 RTXC2, B9 SAMPLE_N, B10 VBAT, C9 WAKEUP2, D8 WAKEUP3, D9 RESET
part S pins: D1 XTAL1, D14 CLK2, E1 XTAL2, N5 CLK0, P12 CLK3, T10 CLK1
part T pins: J4 TDI, J5 TCK, K5 TDO, K6 TMS, L4 DBGEN, M4 TRST
part U pins: C4 VSS@1 (oe), D7 VDDE@1 (oe), D13 VSS@2 (oe), E8 VPP (oe), E12 VDDE@2 (oe), F7 VDDE@3 (oe), F8 VDDE@4 (oe), F9 VDDC@1 (oe), F10 VDDC@2 (oe), G6 VSS@3 (oe), G7 VSS@4 (oe), G8 VSS@5 (oe), G9 VSS@15 (oe), G10 VDDE@5 (oe), H7 VSS@16 (oe), H8 VSS@6 (oe), H9 VSS@7 (oe), H10 VDDE@6 (oe), J6 VDDE@7 (oe), J7 VDDE@8 (oe), J8 VSS@8 (oe), J9 VSS@9 (oe), J10 VSS@17 (oe), J11 VSS@18 (oe), K7 VDDE@9 (oe), K8 VSS@19 (oe), K9 VSS@10 (oe), K10 VSS@11 (oe), L7 VDDC@4 (oe), L8 VDDC@3 (oe), L9 VDDE@10 (oe), L10 VDDE@11 (oe), M13 VSS@12 (oe), N7 VDDE@12 (oe), N13 VDDE@13 (oe), P7 VSS@13 (oe), P13 VSS@14 (oe)
part V pins: F1 USB_VBUS, F2 USB_DP0, F3 USB_VDDA3V3_DRIVER, F12 USB_DP1, G1 USB_VSSA_REF, G2 USB_DM0, G3 USB_VDDA3V3, G12 USB_DM1, H1 USB_RREF, H2 USB_ID, H3 USB_VSSA_TERM
part W pins: L15 SCL (oe), L16 SDA (oe)

## LT3581
designator U?, comment LTC3581 - 3.3A Boost/Inverting DC/DC Converter (Boost/SEPIC/Inverting or Flyback)   Digikey: LT3581EDE#PBF-ND
footprint DFN14_4X3MM
pins: 1 FB, 2 VC, 3 GATE, 4 #FAULT, 5 VIN (power), 6 SW1A (power), 7 SW1B (power), 8 SW2A (power), 9 SW2B (power), 10 CLKOUT (out), 11 #SHDN, 12 RT, 13 SS, 14 SYNC, THERM GND (power)

## LTC3554
designator U?, comment LTC3554 - USB Power Manager with Li-Ion Charger and Two Step-Down Regulators    The LTC3554 is a micropower, highly integrated power management and battery charger IC for single-cell Li-Ion/Polymer battery applications.  The LTC3554 also includes two synchronous step-down switching regulators as well as a pushbutton controller.
footprint QFN20_3MM
pins: 1 HPWR, 2 FSEL, 3 PBSTAT, 4 PGOOD, 5 /ON, 6 FB1, 7 FB2, 8 PWR_ON2, 9 PWR_ON1, 10 STBY, 11 SW2, 12 BVIN, 13 SW1, 14 /CHRG, 15 NTC, 16 PROG, 17 BAT, 18 VOUT, 19 SUSP, 20 VBUS, 21 THERM_GND

## MAX1698
designator U?, comment MX1698/MAX1698A - Step-Up Current Regulator for LEDs   Digikey: MAX1698EUB+-ND
footprint UMAX10
pins: 1 VCC, 2 SHDN, 3 REF, 4 ADJ, 5 GND1, 6 FB, 7 GND2, 8 PGND, 9 CS, 10 EXT

## MAX3421E
designator U?, comment MAX3421E SPI-Interface USB Device/Host Controller    Digikey: MAX3421EETJ+-ND
footprint HVQFN32-5X5_3MMTHERMAL
pins: 1 GPIN7, 2 VL (power), 3 GND1 (power), 4 GPOUT0 (out), 5 GPOUT1 (out), 6 GPOUT2 (out), 7 GPOUT3 (out), 8 GPOUT4 (out), 9 GPOUT5 (out), 10 GPOUT6 (out), 11 GPOUT7 (out), 12 #RES, 13 SCK, 14 #SS, 15 MISO, 16 MOSI, 17 GPX, 18 INT, 19 GND2 (power), 20 D-, 21 D+, 22 VBCOMP, 23 VCC (power), 24 XI, 25 XO, 26 GPIN0, 27 GPIN1, 28 GPIN2, 29 GPIN3, 30 GPIN4, 31 GPIN5, 32 GPIN6, THERMAL GND3(THERMAL) (power)

## MAX6364
designator U?, comment MAX6364 - Low Power Voltage Supervisor (3.08V) with Battery Backup</   This 'battery backup supervisor' will supply up to 150mA of current from VCC.  If VCC ever drops below the 3.08V threshold, the supervisor will automatically switch the power supply to battery power, allowing you to safely 'fall-back' on a secondary power source for critical applications, or where you know that the main power suppy is inherently volatile (solar panels, etc.)   Digikey: MAX6364LUT31+TCT-ND
footprint SOT23-6
pins: 1 RESET, 2 GND (power), 3 RSTIN, 4 VCC (power), 5 OUT, 6 BATT
